# Altium footprint library Miscellaneous Devices LC.PcbLib: 776 footprints (part 34 of 49)
Each footprint in its own frame and in the unit in brackets; x right, y up, seen from the top. Pads: shape width x height; smd on the part's side, far side on the other; paste and mask are expansions set on the pad; w line width, h text height; cw(c..) or ccw(c..) is an arc to the next point about the centre after c.
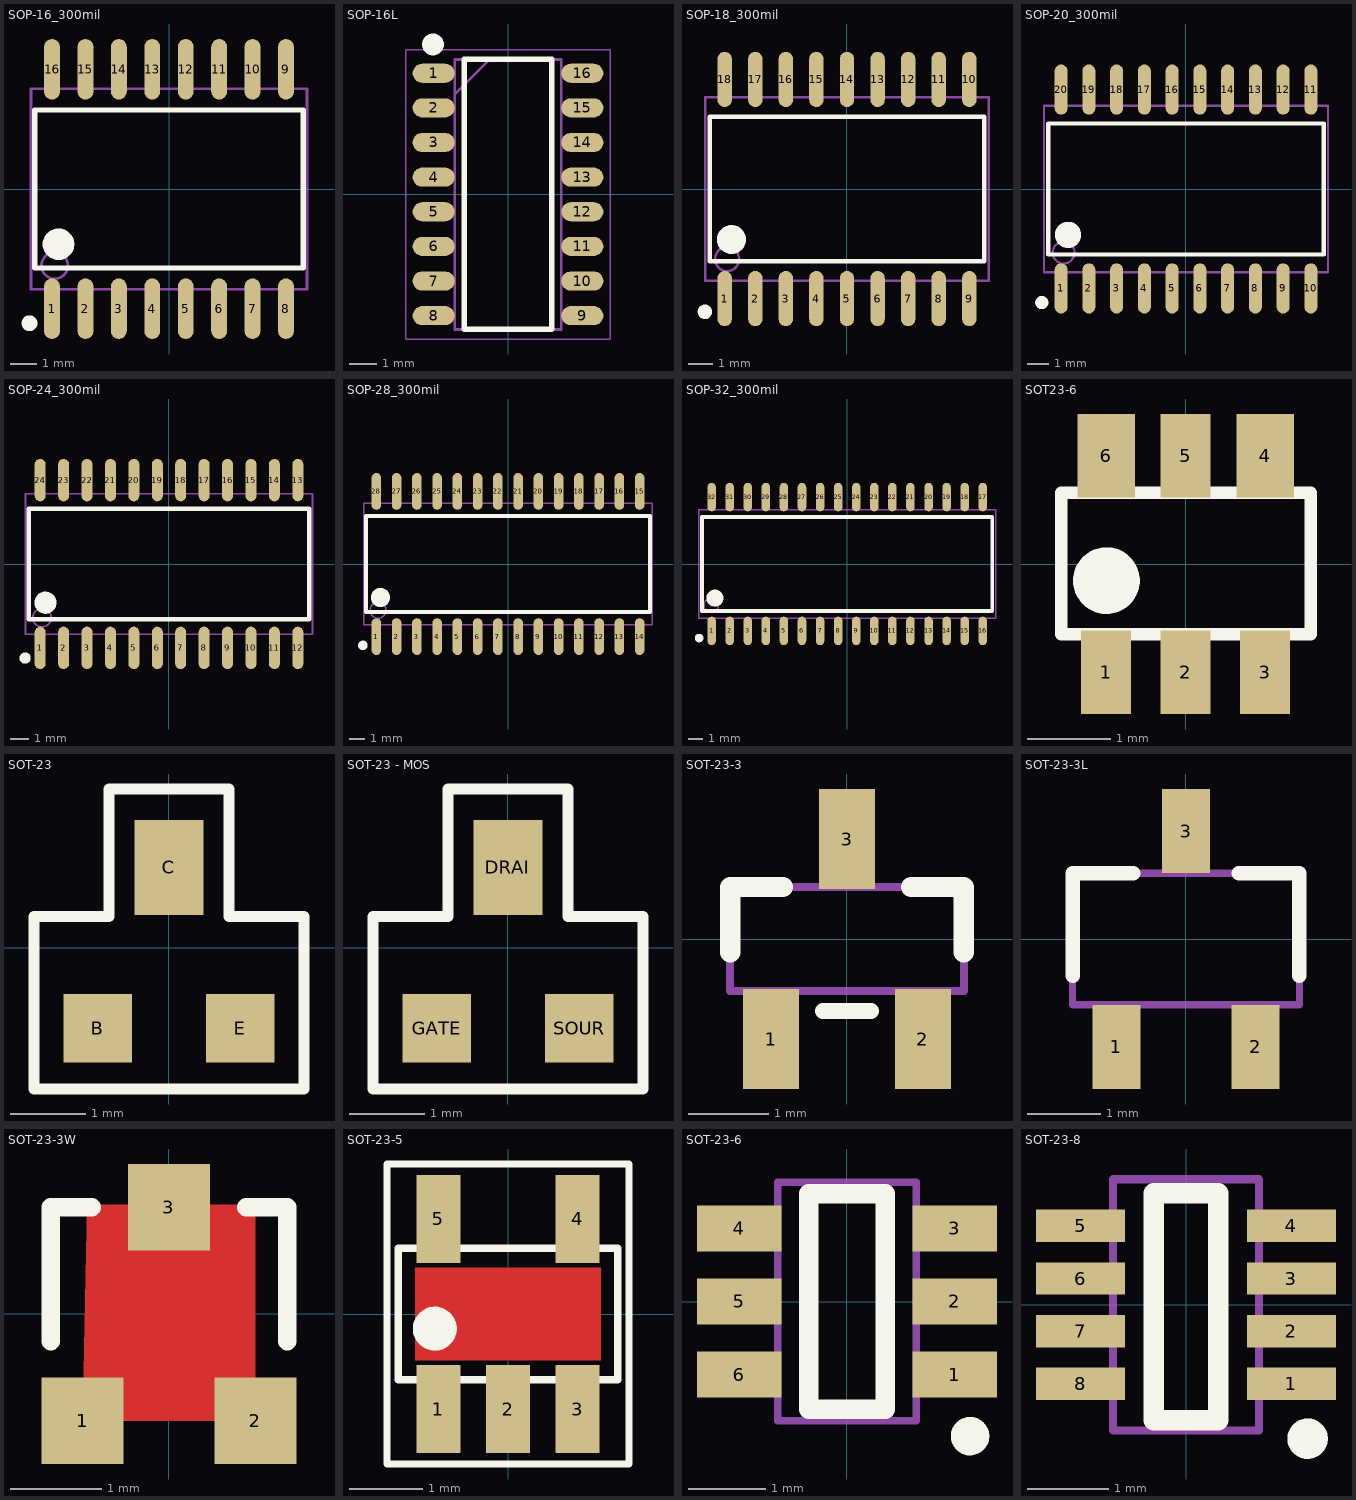
[diagram p33: the footprints below, top view; thin cyan lines are the x and y axes]

## SOP-16_300mil [mm]
pads (16):
  oval 0.6x2.3 smd: 1(-4.445,-4.55) 2(-3.175,-4.55) 3(-1.905,-4.55) 4(-0.635,-4.55) 5(0.635,-4.55) 6(1.905,-4.55) 7(3.175,-4.55) 8(4.445,-4.55) 9(4.445,4.55) 10(3.175,4.55) 11(1.905,4.55) 12(0.635,4.55) 13(-0.635,4.55) 14(-1.905,4.55) 15(-3.175,4.55) 16(-4.445,4.55)
Top Overlay:
  circle w0.3: c-5.3,-5.1 r0.15
  circle w0.6: c-4.2,-2.1 r0.3
  lines w0.2: -5.1,-3 -5.1,3 5.1,3 5.1,-3 -5.1,-3
Mechanical 13:
  circle w0.1: c-4.345,-2.91 r0.5
  lines w0.1: -5.245,-3.81 -5.245,3.81 5.245,3.81 5.245,-3.81 -5.245,-3.81

## SOP-16L [mm] "SOIC127P600X160-16N"
height 1.6
pads (16):
  oval 1.55x0.7 smd: 1(-2.725,4.445) 2(-2.725,3.175) 3(-2.725,1.905) 4(-2.725,0.635) 5(-2.725,-0.635) 6(-2.725,-1.905) 7(-2.725,-3.175) 8(-2.725,-4.445) 9(2.725,-4.445) 10(2.725,-3.175) 11(2.725,-1.905) 12(2.725,-0.635) 13(2.725,0.635) 14(2.725,1.905) 15(2.725,3.175) 16(2.725,4.445)
Top Overlay:
  circle w0.4: c-2.75,5.5 r0.2
  lines w0.2: -1.6,-4.95 1.6,-4.95 1.6,4.95 -1.6,4.95 -1.6,-4.95
Mechanical 15:
  lines w0.1: -1.95,3.68 -0.68,4.95 ; -1.95,-4.95 1.95,-4.95 1.95,4.95 -1.95,4.95 -1.95,-4.95
Mechanical 20:
  lines w0.05: -3.75,-5.3 3.75,-5.3 3.75,5.3 -3.75,5.3 -3.75,-5.3
3D body "HX711.stp": height 1.6, standoff 0, extent -3,-4.95 3,4.95

## SOP-18_300mil [mm]
pads (18):
  oval 0.6x2.3 smd: 1(-5.08,-4.55) 2(-3.81,-4.55) 3(-2.54,-4.55) 4(-1.27,-4.55) 5(0,-4.55) 6(1.27,-4.55) 7(2.54,-4.55) 8(3.81,-4.55) 9(5.08,-4.55) 10(5.08,4.55) 11(3.81,4.55) 12(2.54,4.55) 13(1.27,4.55) 14(0,4.55) 15(-1.27,4.55) 16(-2.54,4.55) 17(-3.81,4.55) 18(-5.08,4.55)
Top Overlay:
  circle w0.3: c-5.9,-5.1 r0.15
  circle w0.6: c-4.8,-2.1 r0.3
  lines w0.2: -5.7,-3 -5.7,3 5.7,3 5.7,-3 -5.7,-3
Mechanical 13:
  circle w0.1: c-4.98,-2.91 r0.5
  lines w0.1: -5.88,-3.81 -5.88,3.81 5.88,3.81 5.88,-3.81 -5.88,-3.81

## SOP-20_300mil [mm]
pads (20):
  oval 0.6x2.3 smd: 1(-5.715,-4.55) 2(-4.445,-4.55) 3(-3.175,-4.55) 4(-1.905,-4.55) 5(-0.635,-4.55) 6(0.635,-4.55) 7(1.905,-4.55) 8(3.175,-4.55) 9(4.445,-4.55) 10(5.715,-4.55) 11(5.715,4.55) 12(4.445,4.55) 13(3.175,4.55) 14(1.905,4.55) 15(0.635,4.55) 16(-0.635,4.55) 17(-1.905,4.55) 18(-3.175,4.55) 19(-4.445,4.55) 20(-5.715,4.55)
Top Overlay:
  circle w0.6: c-5.4,-2.1 r0.3
  circle w0.3: c-6.6,-5.2 r0.15
  lines w0.2: -6.3,-3 -6.3,3 6.3,3 6.3,-3 -6.3,-3
Mechanical 13:
  circle w0.1: c-5.6,-2.91 r0.5
  lines w0.1: -6.5,-3.81 -6.5,3.81 6.5,3.81 6.5,-3.81 -6.5,-3.81

## SOP-24_300mil [mm]
pads (24):
  oval 0.6x2.3 smd: 1(-6.985,-4.55) 2(-5.715,-4.55) 3(-4.445,-4.55) 4(-3.175,-4.55) 5(-1.905,-4.55) 6(-0.635,-4.55) 7(0.635,-4.55) 8(1.905,-4.55) 9(3.175,-4.55) 10(4.445,-4.55) 11(5.715,-4.55) 12(6.985,-4.55) 13(6.985,4.55) 14(5.715,4.55) 15(4.445,4.55) 16(3.175,4.55) 17(1.905,4.55) 18(0.635,4.55) 19(-0.635,4.55) 20(-1.905,4.55) 21(-3.175,4.55) 22(-4.445,4.55) 23(-5.715,4.55) 24(-6.985,4.55)
Top Overlay:
  circle w0.3: c-7.8,-5.1 r0.15
  circle w0.6: c-6.7,-2.1 r0.3
  lines w0.254: -7.6,-3 -7.6,3 7.6,3 7.6,-3 -7.6,-3
Mechanical 13:
  circle w0.1: c-6.885,-2.91 r0.5
  lines w0.1: -7.785,-3.81 -7.785,3.81 7.785,3.81 7.785,-3.81 -7.785,-3.81

## SOP-28_300mil [mm]
pads (28):
  oval 0.6x2.3 smd: 1(-8.255,-4.55) 2(-6.985,-4.55) 3(-5.715,-4.55) 4(-4.445,-4.55) 5(-3.175,-4.55) 6(-1.905,-4.55) 7(-0.635,-4.55) 8(0.635,-4.55) 9(1.905,-4.55) 10(3.175,-4.55) 11(4.445,-4.55) 12(5.715,-4.55) 13(6.985,-4.55) 14(8.255,-4.55) 15(8.255,4.55) 16(6.985,4.55) 17(5.715,4.55) 18(4.445,4.55) 19(3.175,4.55) 20(1.905,4.55) 21(0.635,4.55) 22(-0.635,4.55) 23(-1.905,4.55) 24(-3.175,4.55) 25(-4.445,4.55) 26(-5.715,4.55) 27(-6.985,4.55) 28(-8.255,4.55)
Top Overlay:
  circle w0.6: c-8,-2.1 r0.3
  circle w0.3: c-9.1,-5.1 r0.15
  lines w0.254: -8.9,-3 8.9,-3 8.9,3 -8.9,3 -8.9,-3
Mechanical 13:
  circle w0.1: c-8.15,-2.9 r0.5
  lines w0.1: -9.05,-3.8 9.05,-3.8 9.05,3.8 -9.05,3.8 -9.05,-3.8

## SOP-32_300mil [mm]
pads (32):
  oval 0.6x2 smd: 1(-9.525,-4.7) 2(-8.255,-4.7) 3(-6.985,-4.7) 4(-5.715,-4.7) 5(-4.445,-4.7) 6(-3.175,-4.7) 7(-1.905,-4.7) 8(-0.635,-4.7) 9(0.635,-4.7) 10(1.905,-4.7) 11(3.175,-4.7) 12(4.445,-4.7) 13(5.715,-4.7) 14(6.985,-4.7) 15(8.255,-4.7) 16(9.525,-4.7) 17(9.525,4.7) 18(8.255,4.7) 19(6.985,4.7) 20(5.715,4.7) 21(4.445,4.7) 22(3.175,4.7) 23(1.905,4.7) 24(0.635,4.7) 25(-0.635,4.7) 26(-1.905,4.7) 27(-3.175,4.7) 28(-4.445,4.7) 29(-5.715,4.7) 30(-6.985,4.7) 31(-8.255,4.7) 32(-9.525,4.7)
Top Overlay:
  circle w0.6: c-9.3,-2.4 r0.3
  circle w0.3: c-10.4,-5.2 r0.15
  lines w0.254: -10.2,-3.3 -10.2,3.3 10.2,3.3 10.2,-3.3 -10.2,-3.3
Mechanical 13:
  circle w0.1: c-9.54,-2.9 r0.5
  lines w0.1: -10.44,-3.8 -10.44,3.8 10.44,3.8 10.44,-3.8 -10.44,-3.8

## SOT23-6 [mm]
pads (6):
  rect 0.6x1 smd: 1(-0.953,-1.3) 2(0,-1.3) 3(0.953,-1.3) 5(0,1.3)
  rect 0.69x1 smd: 4(0.953,1.3) 6(-0.953,1.3)
Top Overlay:
  circle w0.5: c-0.95,-0.2 r0.15
  lines w0.15: -1.495,-0.845 1.405,-0.845 1.505,-0.845 1.505,0.855 1.405,0.855 -1.495,0.855 -1.495,-0.845
3D body "User Library-SOT23-6-2.step": height 1.45, standoff 0, extent -1.524,-1.397 1.376,1.403

## SOT-23 [mil]
pads (3):
  rect 36x36 smd: B(-37.4,-42.18) E(37.4,-42.18)
  rect 36x50 smd: C(0,42.18)
Top Overlay:
  lines w5.91: -70.87,-74.11 -70.87,16.44 -31.5,16.44 -31.5,83.37 31.5,83.37 31.5,16.44 70.87,16.44 70.87,-74.11 -70.87,-74.11
3D body "SOT-23.STEP": height 43, standoff 0, extent -55,-51 55,45

## SOT-23 - MOS [mil]
pads (3):
  rect 36x50 smd: DRAI(0,42.18)
  rect 36x36 smd: GATE(-37.4,-42.18) SOUR(37.4,-42.18)
Top Overlay:
  lines w5.91: -70.87,-74.11 -70.87,16.44 -31.5,16.44 -31.5,83.37 31.5,83.37 31.5,16.44 70.87,16.44 70.87,-74.11 -70.87,-74.11
3D body "SOT-23.STEP": height 43, standoff 0, extent -55,-51 55,45

## SOT-23-3 [mm]
pads (3):
  rect 0.7x1.25 smd: 1(-0.95,-1.25) 2(0.95,-1.25) 3(0,1.25)
Top Overlay:
  lines w0.2: -0.3,-0.9 0.3,-0.9
  lines w0.254: -1.46,-0.165 -1.46,0.65 -0.8,0.65 ; 1.46,-0.165 1.46,0.65 ; 0.8,0.65 1.46,0.65 ; 0.8,0.65 1.46,0.65 ; 0.8,0.65 1.46,0.65
Mechanical 13:
  pour cut-out: -1.525,1
  lines w0.1: -1.46,-0.65 1.46,-0.65 ; -1.46,-0.65 -1.46,0.65 ; -1.46,-0.65 1.46,-0.65 ; -1.46,-0.65 -1.46,0.65 ; -1.46,-0.65 -1.46,0.65 ; -1.46,-0.65 1.46,-0.65 ; -1.46,0.65 1.46,0.65 ; -1.46,0.65 1.46,0.65 ; -1.46,0.65 1.46,0.65 ; 1.46,-0.65 1.46,0.65 ; 1.46,-0.65 1.46,0.65 ; 1.46,-0.65 1.46,0.65
3D body "SOT-23-3.STEP": height 1.2, standoff 0, extent -1.45,-1.5 1.45,1.3

## SOT-23-3L [mm] "http://www.aosmd.com/res/packaging_information/SOT-23-3L.pdf"
height 1.25
pads (3):
  rect 0.65x1.15 smd: 1(-0.95,-1.475) 2(0.95,-1.475) 3(0,1.475)
Top Overlay:
  lines w0.2: -1.55,-0.5 -1.55,0.9 -0.725,0.9 ; 0.725,0.9 1.55,0.9 1.55,-0.5
Mechanical 13:
  lines w0.1: -1.55,-0.9 1.55,-0.9 1.55,0.9 -1.55,0.9 -1.55,-0.9
3D body "SOT-23-3.STEP": height 1.2, standoff 0, extent -1.45,-1.4 1.45,1.4

## SOT-23-3W [mm]
height 1.1
pads (3):
  rect 0.9x0.95 smd: 1(-0.95,-1.175) 2(0.95,-1.175) 3(0,1.175)
Top Layer:
  pour cut-out: -0.95,-1.175 0.95,-1.175 0.95,1.15 0.9,1.2 -0.9,1.2
Top Overlay:
  lines w0.2: -1.3,-0.3 -1.3,1.175 -0.85,1.175 ; 0.85,1.175 1.3,1.175 1.3,-0.3
Mechanical 13:
  pour cut-out: -0.025,1
3D body "SOT-23-3.STEP": height 1.2, standoff 0, extent -1.45,-1.3 1.45,1.5

## SOT-23-5 [mm]
pads (5):
  rect 0.6x1.2 smd mask+0.05: 1(-0.95,-1.3) 2(0,-1.3) 3(0.95,-1.3) 4(0.95,1.3) 5(-0.95,1.3)
Top Layer:
  pour cut-out: -1.27,0.635 1.27,0.635 1.27,-0.635 -1.27,-0.635
Top Overlay:
  circle w0.3: c-1,-0.2 r0.15
  lines w0.1: -1.653,-2.05 1.653,-2.05 1.653,2.05 -1.653,2.05 -1.653,-2.05 ; -1.5,-0.9 1.5,-0.9 1.5,0.9 -1.5,0.9 -1.5,-0.9
3D body "SOT-23-5.STEP": height 1.2, standoff 0, extent -1.45,-1.3 1.45,1.5

## SOT-23-6 [mm]
pads (6):
  rect 1.1x0.6 smd: 1(1.4,-0.95) 2(1.4,0) 3(1.4,0.95) 4(-1.4,0.95) 5(-1.4,0) 6(-1.4,-0.95)
Top Overlay:
  circle w0.25: c1.6,-1.75 r0.125
  lines w0.254: -0.5,-1.4 0.5,-1.4 0.5,1.4 -0.5,1.4 -0.5,-1.4
Mechanical 13:
  lines w0.1: -0.9,-1.55 0.9,-1.55 0.9,1.55 -0.9,1.55 -0.9,-1.55

## SOT-23-8 [mm]
pads (8):
  rect 1.1x0.4 smd mask+0.051: 1(1.3,-0.975) 2(1.3,-0.325) 3(1.3,0.325) 4(1.3,0.975) 5(-1.3,0.975) 6(-1.3,0.325) 7(-1.3,-0.325) 8(-1.3,-0.975)
Top Overlay:
  circle w0.25: c1.5,-1.65 r0.125
  lines w0.254: -0.4,-1.425 0.4,-1.425 0.4,1.375 -0.4,1.375 -0.4,-1.425
Mechanical 13:
  lines w0.1: -0.9,-1.55 -0.9,1.55 0.9,1.55 0.9,-1.55 -0.9,-1.55